# Altium footprint library pcb.PcbLib: 397 footprints (part 23 of 25)
Each footprint in its own frame and in the unit in brackets; x right, y up, seen from the top. Pads: shape width x height; smd on the part's side, far side on the other; paste and mask are expansions set on the pad; w line width, h text height; cw(c..) or ccw(c..) is an arc to the next point about the centre after c.
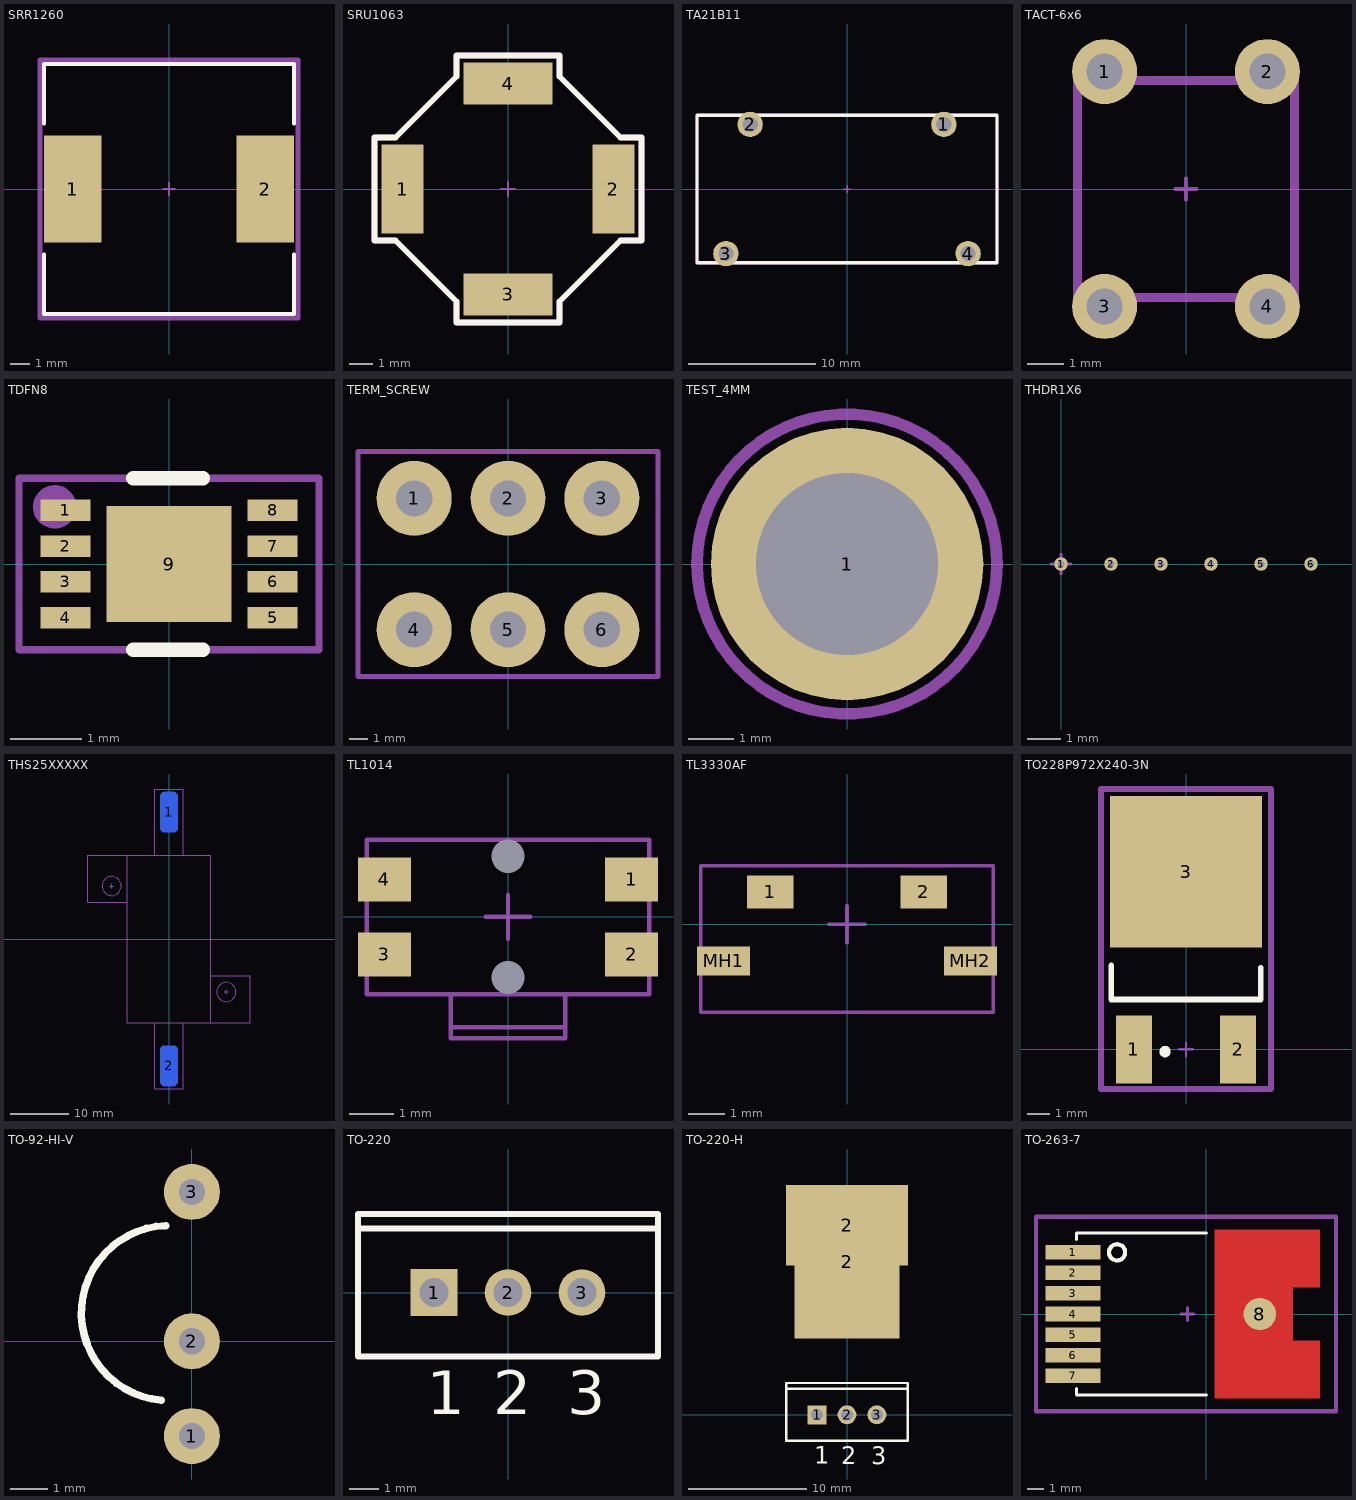
[diagram p22: the footprints below, top view; thin cyan lines are the x and y axes]

## SRR1260 [mm]
height 6
pads (2):
  rect 2.9x5.4 smd: 1(-4.85,0) 2(4.85,0)
Top Overlay:
  lines w0.2: -6.3,-3.3 -6.3,-6.3 6.3,-6.3 6.3,-3.3 ; -6.3,3.3 -6.3,6.3 6.3,6.3 6.3,3.3
Mechanical 15:
  lines w0.1: -0.3,0 0.3,0 ; 0,-0.3 0,0.3
  lines w0.254: -6.5,-6.5 6.5,-6.5 6.5,6.5 -6.5,6.5 -6.5,-6.5
  text ".Designator" at -4.775,2.743 h1.02
3D body: height 6, standoff 0, extent -6,-6 6,6

## SRU1063 [mm]
height 6.3
pads (4):
  rect 1.8x3.8 smd: 1(-4.5,0) 2(4.5,0)
  rect 3.8x1.8 smd: 3(0,-4.5) 4(0,4.5)
Top Overlay:
  lines w0.254: -5.7,-2.2 -5.7,2.2 -4.8,2.2 -2.2,4.8 -2.2,5.7 2.2,5.7 2.2,4.8 4.8,2.2 5.7,2.2 5.7,-2.2 4.8,-2.2 2.2,-4.8 2.2,-5.7 -2.2,-5.7 -2.2,-4.8 -4.8,-2.2 -5.7,-2.2
Mechanical 15:
  lines w0.1: -0.3,0 0.3,0 ; 0,-0.3 0,0.3
  lines w0.254: -5.7,-2.2 -5.7,2.2 -4.8,2.2 -2.2,4.8 -2.2,5.7 2.2,5.7 2.2,4.8 4.8,2.2 5.7,2.2 5.7,-2.2 4.8,-2.2 2.2,-4.8 2.2,-5.7 -2.2,-5.7 -2.2,-4.8 -4.8,-2.2 -5.7,-2.2
  text ".Designator" at -3.7,-2.1 h1.02
3D body: height 6.5, standoff 0, extent -5,-5 5,5

## TA21B11 [mm]
height 25
pads (4):
  round 2 hole 1.2: 1(7.62,5.08) 2(-7.62,5.08) 3(-9.525,-5.08) 4(9.525,-5.08)
Top Overlay:
  lines w0.254: -11.8,-5.8 -11.8,5.8 11.8,5.8 11.8,-5.8 -11.8,-5.8
Mechanical 15:
  lines w0.1: -0.3,0 0.3,0 ; 0,-0.3 0,0.3
  lines w0.254: -11.8,-5.8 11.8,-5.8 11.8,5.8 -11.8,5.8 -11.8,-5.8
  text ".Designator" at -10.2,-2.9 h1.02
3D body "TA21B11.stp": height 25, standoff 0, extent -11.8,-5.7 11.7,5.8

## TACT-6x6 [mm]
height 12.7
pads (4):
  round 1.8 hole 1: 1(-2.25,3.25) 2(2.25,3.25) 3(-2.25,-3.25) 4(2.25,-3.25)
Mechanical 15:
  lines w0.1: -0.3,0 0.3,0 ; 0,-0.3 0,0.3
  lines w0.254: -3,-3 -3,3 3,3 3,-3 -3,-3
  text ".Designator" at -2.4,-2.4 h1.02
3D body: height 3.8, standoff 0, extent -3,-3 3,3

## TDFN8 [mm]
height 1.1
pads (9):
  rect 0.7x0.3 smd: 1(-1.45,0.75) 2(-1.45,0.25) 3(-1.45,-0.25) 4(-1.45,-0.75) 5(1.45,-0.75) 6(1.45,-0.25) 7(1.45,0.25) 8(1.45,0.75)
  rect 1.75x1.63 smd paste-255: 9(0,0)
Top Overlay:
  lines w0.2: -0.5,-1.2 0.475,-1.2 ; -0.5,1.2 0.475,1.2
Top Paste:
  rectangle: -0.75,0.05 -0.1,0.7
  rectangle: 0.1,0.05 0.75,0.7
  rectangle: -0.75,-0.7 -0.1,-0.05
  rectangle: 0.1,-0.7 0.75,-0.05
Mechanical 15:
  circle w0.406: c-1.6,0.8 r0.1
  lines w0.1: -0.5,0 0.5,0 ; 0,-0.5 0,0.5 ; -2.1,-1.2 2.1,-1.2 2.1,1.2 -2.1,1.2 -2.1,-1.2
  text ".Designator" at -1.9,-1 h1.02
3D body: height 1.1, standoff 0, extent -1.5,-1 1.5,1

## TERM_SCREW [mm] "6 Pin 7798 term screw M4"
pads (6):
  round 4 hole 1.93: 1(-5,3.5) 2(0,3.5) 3(5,3.5) 4(-5,-3.5) 5(0,-3.5) 6(5,-3.5)
Mechanical 15:
  lines w0.254: -8,-6 -8,6 8,6 8,-6 -8,-6
  text ".Designator" at -4.9,-0.5 h1.02

## TEST_4MM [mm]
pads (1):
  round 6 hole 4 mask+0: 1(0,0)
Mechanical 13:
  circle w0.254: c0,0 r3.302
Mechanical 15:
  circle w0.254: c-0.002,0 r3.302
3D body: height 2.5, standoff -2.5, extent -1.494,-1.494 1.494,1.5

## THDR1X6 [mil]
height 93.7
pads (6):
  round 16 / inner round 16 / far side rect 40x40 hole 8 paste-10000: 1(0,0)
  round 16 / inner round 16 / far side round 40 hole 8 paste-10000: 2(59.06,0) 3(118.11,0) 4(177.17,0) 5(236.22,0) 6(295.28,0)
Bottom Overlay:
  lines w7.87: -29.53,-29.53 324.8,-29.53 324.8,29.53 -29.53,29.53 -29.53,-29.53
Mechanical 15:
  lines w3.94: -11.81,0 11.81,0 ; 0,-11.81 0,11.81
3D body: height -39.37, standoff -236.22, extent 39.45,-19.61 78.66,19.68
3D body: height -39.37, standoff -236.22, extent -19.61,-19.68 19.61,19.61
3D body: height -39.37, standoff -236.22, extent 98.5,-19.61 137.72,19.68
3D body: height -39.37, standoff -236.22, extent 157.56,-19.61 196.77,19.68
3D body: height -39.37, standoff -236.22, extent 216.61,-19.61 255.83,19.68
3D body: height -39.37, standoff -236.22, extent 275.67,-19.61 314.88,19.68

## THS25XXXXX [mm] "Aluminium Housed Power Resistors 50X30"
pads (2):
  rrect50% 3x7 smd far side: 1(0,21.9) 2(0,-21.9)
Mechanical 15:
  circle w0.2: c9.9,-9.15 r1.65
  circle w0.2: c-9.9,9.15 r1.65
  lines w0.2: -10.3,9.15 -9.5,9.15 ; -9.9,8.75 -9.9,9.55 ; -7.2,6.35 -14,6.35 -14,11.6 -14,14.5 -7.2,14.5 ; -2.5,-14.5 -2.5,-25.9 2.5,-25.9 2.5,-14.5 ; -2.5,14.5 -2.5,25.9 2.5,25.9 2.5,14.5 ; 7.2,-6.35 14,-6.35 14,-11.6 14,-14.5 7.2,-14.5 ; 9.5,-9.15 10.3,-9.15 ; 9.9,-9.55 9.9,-8.75 ; -7.2,14.5 -7.2,-14.5 7.2,-14.5 ; -7.2,14.5 7.2,14.5 7.2,-14.5
3D body "UAL-25.STEP": height 4.1, standoff -10, extent -14,-24.16 13.94,23.96

## TL1014 [mm] "Tact Switch"
height 1.35
pads (6):
  round 0 hole 0.75 unplated: 0(0,-1.375) 0(0,1.375)
  rect 1.2x1 smd: 1(2.8,0.85) 2(2.8,-0.85) 3(-2.8,-0.85) 4(-2.8,0.85)
Mechanical 15:
  lines w0.1: -1.3,-2.5 1.3,-2.5 ; -1.3,-1.75 -1.3,-2.75 1.3,-2.75 1.3,-1.75 ; -0.5,0 0.5,0 ; 0,-0.5 0,0.5 ; -3.2,-1.75 -3.2,1.75 3.2,1.75 3.2,-1.75 -3.2,-1.75
  text ".Designator" at -2.055,-1.067 h0.51
  text "off" at 1.4,-2.8 h0.2
  text "on" at 1.4,-2.55 h0.2
3D body "TL1014BF180QG.stp": height 1.6, standoff -0.5, extent -3.2,-2.75 3.2,1.75

## TL3330AF [mm] "Tact Switch"
height 1.5
pads (4):
  rect 1.27x0.9 smd: 1(-2.1,0.885) 2(2.1,0.885)
  rect 1.45x0.8 smd: MH1(-3.375,-1) MH2(3.375,-1)
Mechanical 15:
  lines w0.1: -0.5,0 0.5,0 ; 0,-0.5 0,0.5 ; -4,-2.4 -4,1.6 4,1.6 4,-2.4 -4,-2.4
  text ".Designator" at -2.055,-1.067 h0.51
3D body "TL3330AFxxxQG (1).stp": height 3.5, standoff 0, extent -3.9,-2.3 3.9,1.322

## TO228P972X240-3N [mm] "D-PAK/TO-252-AA; 3 Leads (1 Cropped); Body 10.4 (inc. leads) x 6.7 mm (LxW max)"
height 2.38
pads (3):
  rect 1.6x3 smd: 1(-2.3,0) 2(2.3,0)
  rect 6.7x6.7 smd paste-1000: 3(0,7.85)
Top Overlay:
  circle w0.25: c-0.925,-0.1 r0.125
  lines w0.254: -3.3,3.7 -3.3,2.7 -3.3,2.2 3.3,2.2 3.3,3.6
Top Paste:
  rectangle: 0.305,4.928 3.005,7.628
  rectangle: 0.254,8.128 2.954,10.828
  rectangle: -2.946,8.128 -0.246,10.828
  rectangle: -2.946,4.928 -0.246,7.628
Mechanical 15:
  lines w0.1: -0.3,0 0.3,0 ; 0,-0.3 0,0.3
  lines w0.254: -3.75,-1.75 -3.75,11.5 3.75,11.5 3.75,-1.75 -3.75,-1.75
  text ".Designator" at -3,9.5 h1.02
3D body: height 1, standoff 0, extent -3.1,2.9 3.1,9.5

## TO-92-HI-V [mm] "TO, Flat Index; 3 In-Line, Axial Leads; Body Dia. 4.6mm; Leads 0.41 x 0.39 mm (max)"
height 4.7
pads (3):
  round 1.5 hole 0.7: 1(0,-2.54) 2(0,0) 3(0,4)
Top Overlay:
  lines w0.2: -0.816,-1.584 cw(c-0.613,0.754) -0.7,3.1
Mechanical 15:
  lines w0.1: -0.5,0 0.5,0 ; 0,-0.5 0,0.5

## TO-220 [mm] "TO, Thru-Hole, Vertical, Heatsink Mounted; 3 In-Line Leads; Pitch 2.54 mm"
height 19.7
pads (3):
  rect 1.6x1.6 hole 1: 1(-2.54,0)
  round 1.6 hole 1: 2(0,0) 3(2.54,0)
Top Overlay:
  lines w0.2: -5.15,2.2 5.15,2.2 ; -5.15,-2.2 5.15,-2.2 5.15,2.7 -5.15,2.7 -5.15,-2.2
  text "1" at -2.79,-4.175 h1.5
  text "2" at -0.5,-4.175 h1.5
  text "3" at 2.04,-4.175 h1.5

## TO-220-H [mm] "TO, Thru-Hole, Horizontal, PCB Mounted; 3 In-Line Leads; Pitch 2.54 mm"
height 19.7
pads (5):
  rect 1.6x1.6 hole 1: 1(-2.54,0)
  round 1.6 hole 1: 2(0,0) 3(2.54,0)
  rect 8.9x13 smd paste-1000: 2(0,13)
  rect 10.4x6.8 smd paste-1000: 2(0,16.1)
Top Overlay:
  lines w0.2: -5.15,2.2 5.15,2.2 ; -5.15,-2.2 5.15,-2.2 5.15,2.7 -5.15,2.7 -5.15,-2.2
  text "1" at -2.79,-4.175 h1.5
  text "2" at -0.5,-4.175 h1.5
  text "3" at 2.04,-4.175 h1.5
Top Paste:
  rectangle: -4.5,15.5 4.5,18.5
  rectangle: -4.5,11.5 4.5,14.5
  rectangle: -4.5,7.5 4.5,10.5
3D body: height 4.6, standoff 0, extent -5.1,3.7 5.1,13.1
3D body: height 1.3, standoff 0, extent -5.1,13.1 5.1,19.6

## TO-263-7 [mm] "D2PAK 7LEAD"
pads (8):
  rect 3.4x0.9 smd: 1(-8.229,3.81) 2(-8.229,2.54) 3(-8.229,1.27) 4(-8.229,0) 5(-8.229,-1.27) 6(-8.229,-2.54) 7(-8.229,-3.81)
  round 2 smd paste-4: 8(3.302,0)
Top Layer:
  region: 0.508,-5.207 7,-5.207 6.985,-5.207 6.985,-1.651 5.32,-1.651 5.32,1.65 6.985,1.65 6.985,5.207 0.508,5.207
Top Overlay:
  circle w0.254: c-5.5,3.8 r0.5
  lines w0.2: -8,-4.6 -8,-5 0,-5 ; -8,4.6 -8,5 0,5
Top Paste:
  region: 3.81,-4.826 3.81,-0.508 4.699,-0.508 4.699,-2.286 6.223,-2.286 6.223,-4.826
  region: 3.81,4.826 3.81,0.508 4.699,0.508 4.699,2.286 6.223,2.286 6.223,4.826
  region: 0.889,4.826 3.175,4.826 3.175,0.508 0.889,0.508
  region: 0.889,-0.508 3.175,-0.508 3.175,-4.826 0.889,-4.826
Mechanical 15:
  lines w0.2: -1.553,0.003 -0.753,0.003 ; -1.15,-0.4 -1.15,0.4
  lines w0.254: -10.5,-6 8,-6 8,6 -10.5,6 -10.5,-6
  text ".Designator" at -10.5,-5.6 h1.02
3D body "User Library-TO263-7-1.STEP": height 4.78, standoff -0.02, extent -8.99,-5 6.68,5